# Altium footprint library hallglib.PcbLib: 122 footprints (part 1 of 8)
Each footprint in its own frame and in the unit in brackets; x right, y up, seen from the top. Pads: shape width x height; smd on the part's side, far side on the other; paste and mask are expansions set on the pad; w line width, h text height; cw(c..) or ccw(c..) is an arc to the next point about the centre after c.
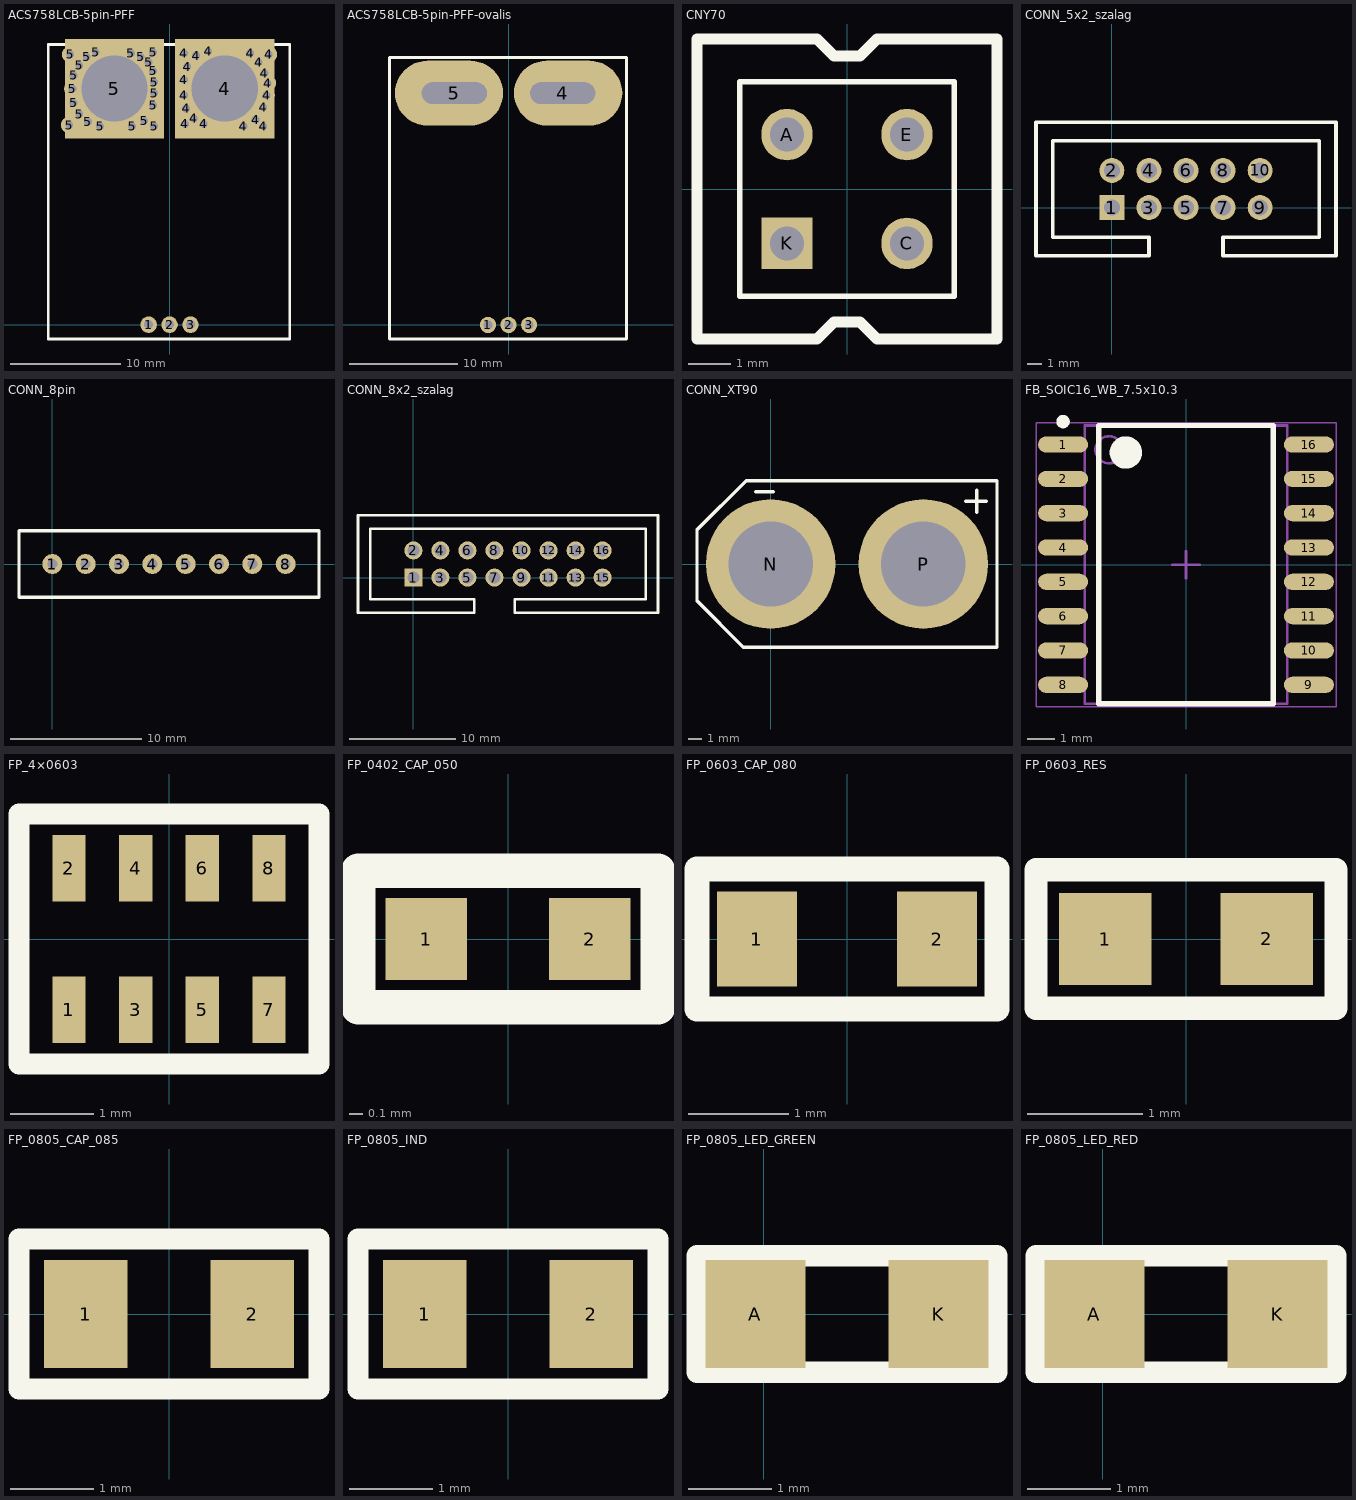
[diagram p0: the footprints below, top view; thin cyan lines are the x and y axes]

## ACS758LCB-5pin-PFF [mm]
pads (47):
  round 1.5 hole 0.8: 1(-1.9,0) 2(0,0) 3(1.9,0)
  round 1.524 hole 0.7: 4(1.3,20.8) 4(1.3,22.2) 4(1.3,24.6) 4(1.4,18.2) 4(1.5,19.6) 4(1.6,23.4) 4(2.2,18.7) 4(2.4,24.4) 4(3.1,18.2) 4(3.5,24.8) 4(6.7,18) 4(7.3,24.6) 4(7.8,18.6) 4(8.1,23.8) 4(8.5,18) 4(8.5,19.7) 4(8.6,22.8) 4(8.8,20.8) 4(8.9,21.9) 4(9,24.5) 5(-9.1,18.1) 5(-9,24.5) 5(-8.8,21.4) 5(-8.7,20.1) 5(-8.7,22.6) 5(-8.2,19.1) 5(-8.2,23.5) 5(-7.5,24.3) 5(-7.4,18.4) 5(-6.7,24.7) 5(-6.3,18) 5(-3.5,24.6) 5(-3.4,18) 5(-2.6,24.3) 5(-2.3,18.5) 5(-1.9,23.8) 5(-1.5,19.9) 5(-1.5,23) 5(-1.5,24.7) 5(-1.4,18) 5(-1.4,21) 5(-1.4,22)
  rect 9x9 hole 6: 4(5,21.4) 5(-5,21.4)
Top Overlay:
  lines w0.254: -11,-1.3 -11,25.4 10.9,25.4 10.9,-1.3 -11,-1.3

## ACS758LCB-5pin-PFF-ovalis [mm]
pads (5):
  round 1.5 hole 0.8: 1(-1.9,0) 2(0,0) 3(1.9,0)
  oval 10x6 hole 2 slot 6 at 0 deg copper offset 0.5,0: 4(5,21.4)
  oval 10x6 hole 2 slot 6 at 0 deg copper offset -0.5,0: 5(-5,21.4)
Top Overlay:
  lines w0.254: -11,-1.3 -11,24.7 10.9,24.7 10.9,-1.3 -11,-1.3
Multi-Layer:
  rectangle: 0.5,18.9 2,23.7
  rectangle: -2,18.9 -0.5,23.7

## CNY70 [mm]
height 6
pads (4):
  round 1.2 hole 0.8: A(-1.4,1.27) C(1.4,-1.27) E(1.4,1.27)
  rect 1.2x1.2 hole 0.8: K(-1.4,-1.27)
Top Overlay:
  lines w0.127: -2.5,-2.5 2.5,-2.5 2.5,2.5 -2.5,2.5 -2.5,-2.5
  lines w0.254: -3.5,-3.5 -3.5,3.5 -0.7,3.5 -0.3,3.1 0.3,3.1 0.7,3.5 3.5,3.5 3.5,-3.5 0.7,-3.5 0.3,-3.1 -0.3,-3.1 -0.7,-3.5 -3.5,-3.5
3D body "SW3dPS-cny70-1.STEP": height 6.02, standoff -5.73, extent -3.5,-3.5 3.5,3.5

## CONN_5x2_szalag [mm]
pads (10):
  rect 1.7x1.7 hole 1.1: 1(0,0)
  round 1.7 hole 1.1: 2(0,2.54) 3(2.54,0) 4(2.54,2.54) 5(5.08,0) 6(5.08,2.54) 7(7.62,0) 8(7.62,2.54) 9(10.16,0) 10(10.16,2.54)
Top Overlay:
  lines w0.254: -5.207,-3.302 2.54,-3.302 2.54,-2.032 -4.064,-2.032 -4.064,4.572 14.224,4.572 14.224,-2.032 7.62,-2.032 7.62,-3.302 15.367,-3.302 15.367,5.842 -5.207,5.842 -5.207,-3.302

## CONN_8pin [mil]
pads (8):
  round 60 hole 30: 1(0,0) 2(100,0) 3(200,0) 4(300,0) 5(400,0) 6(500,0) 7(600,0) 8(700,0)
Top Overlay:
  lines w10: -100,-100 -100,100 800,100 800,-100 -100,-100

## CONN_8x2_szalag [mm]
pads (16):
  rect 1.7x1.7 hole 1.1: 1(0,0)
  round 1.7 hole 1.1: 2(0,2.54) 3(2.54,0) 4(2.54,2.54) 5(5.08,0) 6(5.08,2.54) 7(7.62,0) 8(7.62,2.54) 9(10.16,0) 10(10.16,2.54) 11(12.7,0) 12(12.7,2.54) 13(15.24,0) 14(15.24,2.54) 15(17.78,0) 16(17.78,2.54)
Top Overlay:
  lines w0.254: 21.844,0 21.844,4.572 ; 21.844,4.572 21.844,-2.032 19.304,-2.032 9.525,-2.032 9.525,-3.302 20.447,-3.302 22.987,-3.302 22.987,2.54 22.987,5.842 20.447,5.842 -5.207,5.842 -5.207,-3.302 5.715,-3.302 5.715,-2.032 -4.064,-2.032 -4.064,4.572 19.304,4.572 21.844,4.572

## CONN_XT90 [mm]
pads (2):
  round 9.5 hole 6.2: N(0,0) P(11.2,0)
Top Overlay:
  lines w0.254: -1.1,5.3 0.2,5.3 ; 15.1,3.8 15.1,5.4 ; 15.1,4.6 14.3,4.6 15.8,4.6 ; -5.4,-2.7 -5.4,2.5 -1.8,6.1 0,6.1 16.6,6.1 16.6,-5.5 16.6,-5.8 16.6,-6.1 -2,-6.1 -5.4,-2.7

## FB_SOIC16_WB_7.5x10.3 [mm]
pads (16):
  oval 1.85x0.6 smd: 1(-4.55,4.445) 2(-4.55,3.175) 3(-4.55,1.905) 4(-4.55,0.635) 5(-4.55,-0.635) 6(-4.55,-1.905) 7(-4.55,-3.175) 8(-4.55,-4.445) 9(4.55,-4.445) 10(4.55,-3.175) 11(4.55,-1.905) 12(4.55,-0.635) 13(4.55,0.635) 14(4.55,1.905) 15(4.55,3.175) 16(4.55,4.445)
Top Overlay:
  circle w0.25: c-4.55,5.295 r0.125
  circle w0.6: c-2.225,4.15 r0.3
  lines w0.2: -3.225,-5.15 -3.225,5.15 3.225,5.15 3.225,-5.15 -3.225,-5.15
Mechanical 13:
  circle w0.1: c-2.85,4.25 r0.5
  lines w0.1: -3.75,-5.15 -3.75,5.15 3.75,5.15 3.75,-5.15 -3.75,-5.15
Mechanical 15:
  lines w0.05: -5.55,-5.25 -5.55,5.25 5.55,5.25 5.55,-5.25 -5.55,-5.25
  lines w0.1: -0.5,0 0.5,0 ; 0,-0.5 0,0.5
3D body: height 2.65, standoff 0.1, extent -3.75,-5.15 3.75,5.15

## FP_4×0603 [mm] "4×0603-as ellenállásháló"
pads (8):
  rect 0.4x0.8 smd: 1(-1.2,-0.85) 2(-1.2,0.85) 3(-0.4,-0.85) 4(-0.4,0.85) 5(0.4,-0.85) 6(0.4,0.85) 7(1.2,-0.85) 8(1.2,0.85)
Top Overlay:
  lines w0.254: -1.8,-1.5 -1.8,1.5 1.8,1.5 1.8,-1.5 -1.8,-1.5
3D body "RN164P.STEP": height 0.55, standoff 0, extent -1.6,-0.8 1.6,0.8

## FP_0402_CAP_050 [mm] "0.5mm magas 0402 kapacitás"
height 0.55
pads (2):
  rect 0.6x0.6 smd: 1(-0.6,0) 2(0.6,0)
Top Overlay:
  lines w0.254: -1.1,-0.5 -1.1,0.5 1.1,0.5 1.1,-0.5 -1.1,-0.5
3D body: height 0.5, standoff 0, extent -0.3,-0.25 0.3,0.25
3D body: height 0.5, standoff 0, extent 0.3,-0.25 0.5,0.25
3D body: height 0.5, standoff 0, extent -0.5,-0.25 -0.3,0.25

## FP_0603_CAP_080 [mm] "0.8mm magas 0603 kapacitás"
height 0.9
pads (2):
  rect 0.8x0.95 smd: 1(-0.9,0) 2(0.9,0)
Top Overlay:
  lines w0.254: -1.5,-0.7 -1.5,0.7 1.5,0.7 1.5,-0.7 -1.5,-0.7
3D body: height 0.8, standoff 0, extent -0.5,-0.4 0.5,0.4
3D body: height 0.8, standoff 0, extent 0.5,-0.4 0.762,0.4
3D body: height 0.8, standoff 0, extent -0.8,-0.4 -0.5,0.4

## FP_0603_RES [mm] "0603 ellenállás"
height 0.55
pads (2):
  rect 0.8x0.8 smd: 1(-0.7,0) 2(0.7,0)
Top Overlay:
  lines w0.2: -1.3,-0.6 -1.3,0.6 1.3,0.6 1.3,-0.6 -1.3,-0.6
3D body "0603RES.STEP": height 0.44, standoff -0.01, extent -0.8,-0.4 0.8,0.4

## FP_0805_CAP_085 [mm] "0805 kapacitás YAGEO 0.85mm magas"
height 0.86
pads (2):
  rect 1x1.3 smd: 1(-1,0) 2(1,0)
Top Overlay:
  lines w0.254: -1.8,-0.9 1.8,-0.9 1.8,0.9 -1.8,0.9 -1.8,-0.9
3D body: height 0.85, standoff 0, extent -1,-0.635 -0.644,0.635
3D body: height 0.85, standoff 0, extent 0.676,-0.635 1.032,0.635
3D body: height 0.85, standoff 0, extent -0.644,-0.635 0.676,0.635

## FP_0805_IND [mm] "0805 power inductor"
height 1.45
pads (2):
  rect 1x1.3 smd: 1(-1,0) 2(1,0)
Top Overlay:
  lines w0.254: -1.8,-0.9 1.8,-0.9 1.8,0.9 -1.8,0.9 -1.8,-0.9
3D body: height 1.25, standoff 0, extent -1,-0.635 -0.644,0.635
3D body: height 1.25, standoff 0, extent 0.676,-0.635 1.032,0.635
3D body: height 1.25, standoff 0, extent -0.644,-0.635 0.676,0.635

## FP_0805_LED_GREEN [mm] "0805 méretû zöld LED"
height 1
pads (2):
  rect 1.2x1.3 smd: A(-0.1,0) K(2.1,0)
Top Overlay:
  lines w0.254: 2.3,-0.7 2.3,0.7 ; -0.8,-0.7 -0.8,0.7 2.8,0.7 2.8,-0.7 -0.8,-0.7
3D body "led_0805_green.step": height 1.1, standoff 0, extent 0.006,-0.625 2.026,0.625

## FP_0805_LED_RED [mm] "0805 méretû piros LED"
height 1
pads (2):
  rect 1.2x1.3 smd: A(-0.1,0) K(2.1,0)
Top Overlay:
  lines w0.254: 2.3,-0.7 2.3,0.7 ; -0.8,-0.7 -0.8,0.7 2.8,0.7 2.8,-0.7 -0.8,-0.7
3D body "led_0805r.STEP": height 1.1, standoff 0, extent 0.006,-0.625 2.026,0.625